# Altium footprint library Miscellaneous Connectors.PcbLib: 248 footprints (part 14 of 16)
Each footprint in its own frame and in the unit in brackets; x right, y up, seen from the top. Pads: shape width x height; smd on the part's side, far side on the other; paste and mask are expansions set on the pad; w line width, h text height; cw(c..) or ccw(c..) is an arc to the next point about the centre after c.
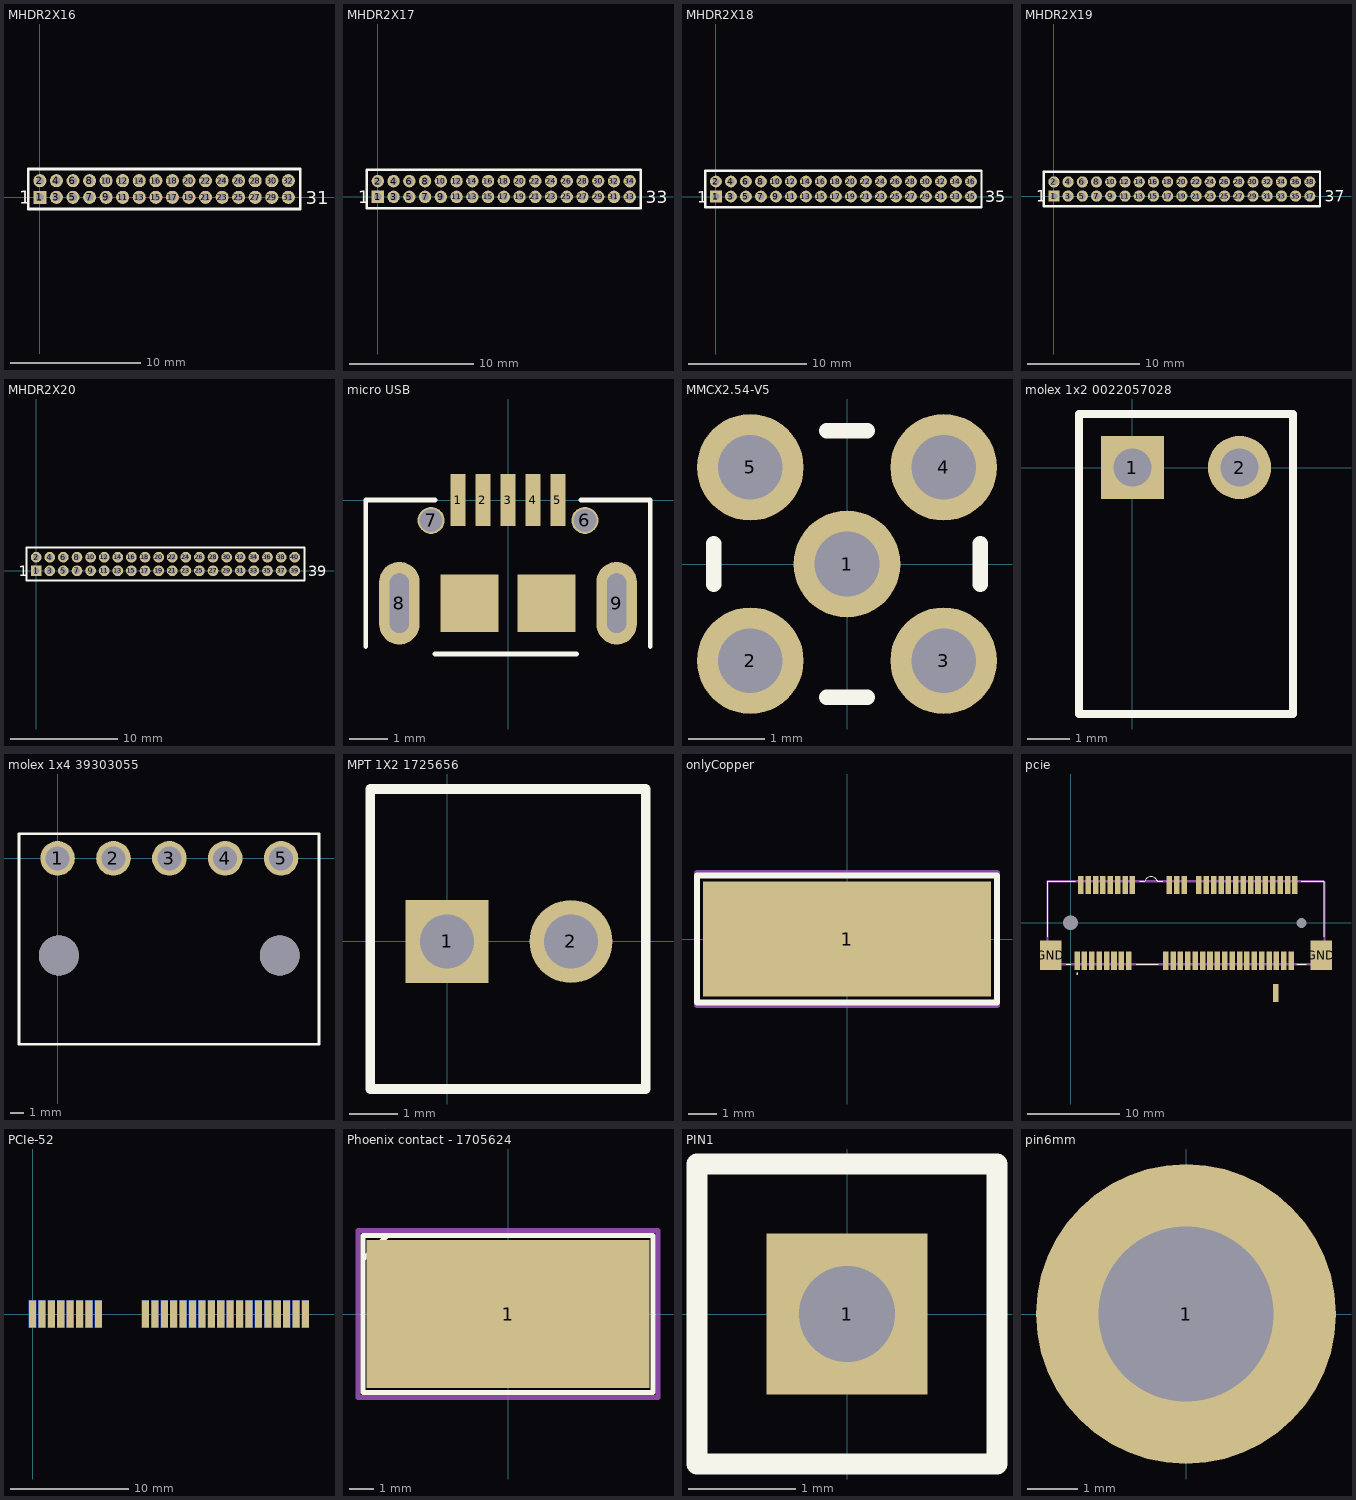
[diagram p13: the footprints below, top view; thin cyan lines are the x and y axes]

## MHDR2X16 [mm] "Connector; Header; 16x2 Position"
pads (32):
  rect 1x1 hole 0.6: 1(0,0)
  round 1 hole 0.6: 2(0,1.27) 3(1.27,0) 4(1.27,1.27) 5(2.54,0) 6(2.54,1.27) 7(3.81,0) 8(3.81,1.27) 9(5.08,0) 10(5.08,1.27) 11(6.35,0) 12(6.35,1.27) 13(7.62,0) 14(7.62,1.27) 15(8.89,0) 16(8.89,1.27) 17(10.16,0) 18(10.16,1.27) 19(11.43,0) 20(11.43,1.27) 21(12.7,0) 22(12.7,1.27) 23(13.97,0) 24(13.97,1.27) 25(15.24,0) 26(15.24,1.27) 27(16.51,0) 28(16.51,1.27) 29(17.78,0) 30(17.78,1.27) 31(19.05,0) 32(19.05,1.27)
Top Overlay:
  lines w0.2: -0.9,-0.9 -0.9,2.17 19.95,2.17 19.95,-0.9 -0.9,-0.9
  text "31" at 20.4,-0.522 h1
  text "1" at -1.6,-0.508 h1

## MHDR2X17 [mm] "Connector; Header; 17x2 Position"
pads (34):
  rect 1x1 hole 0.6: 1(0,0)
  round 1 hole 0.6: 2(0,1.27) 3(1.27,0) 4(1.27,1.27) 5(2.54,0) 6(2.54,1.27) 7(3.81,0) 8(3.81,1.27) 9(5.08,0) 10(5.08,1.27) 11(6.35,0) 12(6.35,1.27) 13(7.62,0) 14(7.62,1.27) 15(8.89,0) 16(8.89,1.27) 17(10.16,0) 18(10.16,1.27) 19(11.43,0) 20(11.43,1.27) 21(12.7,0) 22(12.7,1.27) 23(13.97,0) 24(13.97,1.27) 25(15.24,0) 26(15.24,1.27) 27(16.51,0) 28(16.51,1.27) 29(17.78,0) 30(17.78,1.27) 31(19.05,0) 32(19.05,1.27) 33(20.32,0) 34(20.32,1.27)
Top Overlay:
  lines w0.2: -0.9,-0.9 21.22,-0.9 21.22,2.17 -0.9,2.17 -0.9,-0.9
  text "1" at -1.6,-0.508 h1
  text "33" at 21.6,-0.508 h1

## MHDR2X18 [mm] "Connector; Header; 18x2 Position"
pads (36):
  rect 1x1 hole 0.6: 1(0,0)
  round 1 hole 0.6: 2(0,1.27) 3(1.27,0) 4(1.27,1.27) 5(2.54,0) 6(2.54,1.27) 7(3.81,0) 8(3.81,1.27) 9(5.08,0) 10(5.08,1.27) 11(6.35,0) 12(6.35,1.27) 13(7.62,0) 14(7.62,1.27) 15(8.89,0) 16(8.89,1.27) 17(10.16,0) 18(10.16,1.27) 19(11.43,0) 20(11.43,1.27) 21(12.7,0) 22(12.7,1.27) 23(13.97,0) 24(13.97,1.27) 25(15.24,0) 26(15.24,1.27) 27(16.51,0) 28(16.51,1.27) 29(17.78,0) 30(17.78,1.27) 31(19.05,0) 32(19.05,1.27) 33(20.32,0) 34(20.32,1.27) 35(21.59,0) 36(21.59,1.27)
Top Overlay:
  lines w0.2: -0.9,-0.9 -0.9,2.17 22.49,2.17 22.49,-0.9 -0.9,-0.9
  text "35" at 22.8,-0.501 h1
  text "1" at -1.6,-0.508 h1

## MHDR2X19 [mm] "Connector; Header; 19x2 Position"
pads (38):
  rect 1x1 hole 0.6: 1(0,0)
  round 1 hole 0.6: 2(0,1.27) 3(1.27,0) 4(1.27,1.27) 5(2.54,0) 6(2.54,1.27) 7(3.81,0) 8(3.81,1.27) 9(5.08,0) 10(5.08,1.27) 11(6.35,0) 12(6.35,1.27) 13(7.62,0) 14(7.62,1.27) 15(8.89,0) 16(8.89,1.27) 17(10.16,0) 18(10.16,1.27) 19(11.43,0) 20(11.43,1.27) 21(12.7,0) 22(12.7,1.27) 23(13.97,0) 24(13.97,1.27) 25(15.24,0) 26(15.24,1.27) 27(16.51,0) 28(16.51,1.27) 29(17.78,0) 30(17.78,1.27) 31(19.05,0) 32(19.05,1.27) 33(20.32,0) 34(20.32,1.27) 35(21.59,0) 36(21.59,1.27) 37(22.86,0) 38(22.86,1.27)
Top Overlay:
  lines w0.2: -0.9,-0.9 -0.9,2.17 23.76,2.17 23.76,-0.9 -0.9,-0.9
  text "37" at 24.2,-0.508 h1
  text "1" at -1.6,-0.508 h1

## MHDR2X20 [mm] "Connector; Header; 20x2 Position"
pads (40):
  rect 1x1 hole 0.6: 1(0,0)
  round 1 hole 0.6: 2(0,1.27) 3(1.27,0) 4(1.27,1.27) 5(2.54,0) 6(2.54,1.27) 7(3.81,0) 8(3.81,1.27) 9(5.08,0) 10(5.08,1.27) 11(6.35,0) 12(6.35,1.27) 13(7.62,0) 14(7.62,1.27) 15(8.89,0) 16(8.89,1.27) 17(10.16,0) 18(10.16,1.27) 19(11.43,0) 20(11.43,1.27) 21(12.7,0) 22(12.7,1.27) 23(13.97,0) 24(13.97,1.27) 25(15.24,0) 26(15.24,1.27) 27(16.51,0) 28(16.51,1.27) 29(17.78,0) 30(17.78,1.27) 31(19.05,0) 32(19.05,1.27) 33(20.32,0) 34(20.32,1.27) 35(21.59,0) 36(21.59,1.27) 37(22.86,0) 38(22.86,1.27) 39(24.13,0) 40(24.13,1.27)
Top Overlay:
  lines w0.2: -0.9,-0.9 -0.9,2.17 25.03,2.17 25.03,-0.9 -0.9,-0.9
  text "39" at 25.4,-0.508 h1
  text "1" at -1.6,-0.508 h1

## micro USB [mm] "USB3080-30-00-A"
pads (11):
  rect 0.4x1.35 smd: 1(-1.3,0) 2(-0.65,0) 3(0,0) 4(0.65,0) 5(1.3,0)
  round 0.7 hole 0.6 mask+0: 6(2,-0.53) 7(-2,-0.53)
  oval 1.05x2.15 hole 0.5 slot 1.55 at 90 deg: 8(-2.825,-2.68) 9(2.825,-2.68)
  rect 1.5x1.5 smd: ""(-1,-2.68) ""(1,-2.68)
Top Overlay:
  lines w0.127: -3.7,-3.81 -3.7,0 -1.9,0 ; -1.905,-4 1.778,-4 ; 1.9,0 3.7,0 3.7,-3.81

## MMCX2.54-V5 [mm] "Connector; RF Coaxial, MMCX, Thru-Hole; 5 Position; Vertical"
height 4.45
pads (5):
  round 1.4 hole 0.85: 1(0,0) 2(-1.27,-1.27) 3(1.27,-1.27) 4(1.27,1.27) 5(-1.27,1.27)
Top Overlay:
  lines w0.2: -1.75,-0.27 -1.75,0.27 ; -0.27,-1.75 0.27,-1.75 ; -0.27,1.75 0.27,1.75 ; 1.75,-0.27 1.75,0.27

## molex 1x2 0022057028 [mm] "conector molex 1x2"
pads (2):
  rect 1.5x1.5 hole 0.9: 1(0,0)
  round 1.5 hole 0.9: 2(2.54,0)
Top Overlay:
  lines w0.2: -1.27,-5.85 -1.27,1.27 3.81,1.27 3.81,-5.85 -1.27,-5.85
3D body "conector molex - 022057028.stp": height 6.12, standoff -3.52, extent -1.265,-14.438 3.815,0.3

## molex 1x4 39303055 [mm] "conector molex 1x4 hembra"
pads (7):
  round 2.6 hole 1.8: 1(0,0) 2(4.2,0) 3(8.4,0) 4(12.6,0) 5(16.8,0)
  round 3 hole 3 mask+0.102: ""(0.098,-7.3) ""(16.702,-7.3)
Top Overlay:
  lines w0.2: 19.625,1.85 -2.9,1.85 -2.9,-13.975 19.65,-13.975 19.65,1.85
3D body "conector molex - 039303055.stp": height 7.2, standoff -3.5, extent -2.7,-13.81 19.5,0.625

## MPT 1X2 1725656 [mm] "PHOENIX CONTACT; pitch 2.54"
pads (2):
  rect 1.7x1.7 hole 1.1: 1(0,0)
  round 1.7 hole 1.1: 2(2.54,0)
Top Overlay:
  lines w0.2: -1.575,-3.025 4.075,-3.025 4.075,3.125 -1.575,3.125 -1.575,-3.025
3D body "conector MPT-0-5-2-2-54 1725656.stp": height 8.5, standoff -3.5, extent -1.6,-3 4,3.2

## onlyCopper [mm] "pad"
pads (1):
  rect 10x4 smd: 1(0,0)
Top Overlay:
  lines w0.2: -5.2,-2.2 -5.2,2.2 5.2,2.2 5.2,-2.2 -5.2,-2.2
Mechanical 15:
  lines w0.2: -5.2,-2.3 5.2,-2.3 5.2,2.3 -5.2,2.3 -5.2,-2.3

## pcie [mm]
height 12.65
pads (56):
  rect 0.6x2 smd paste-2: 1(0.7,-4.1) 2(1.1,4.1) 3(1.5,-4.1) 4(1.9,4.1) 5(2.3,-4.1) 6(2.7,4.1) 7(3.1,-4.1) 8(3.5,4.1) 9(3.9,-4.1) 10(4.3,4.1) 11(4.7,-4.1) 12(5.1,4.1) 13(5.5,-4.1) 14(5.9,4.1) 15(6.3,-4.1) 16(6.7,4.1) 17(10.3,-4.1) 18(10.7,4.1) 19(11.1,-4.1) 20(11.5,4.1) 21(11.9,-4.1) 22(12.3,4.1) 23(12.7,-4.1) 24(22.2,-7.6) 25(13.5,-4.1) 26(13.9,4.1) 27(14.3,-4.1) 28(14.7,4.1) 29(15.1,-4.1) 30(15.5,4.1) 31(15.9,-4.1) 32(16.3,4.1) 33(16.7,-4.1) 34(17.1,4.1) 35(17.5,-4.1) 36(17.9,4.1) 37(18.3,-4.1) 38(18.7,4.1) 39(19.1,-4.1) 40(19.5,4.1) 41(19.9,-4.1) 42(20.3,4.1) 43(20.7,-4.1) 44(21.1,4.1) 45(21.5,-4.1) 46(21.9,4.1) 47(22.3,-4.1) 48(22.7,4.1) 49(23.1,-4.1) 50(23.5,4.1) 51(23.9,-4.1) 52(24.3,4.1)
  rect 2.3x3.2 smd paste-2: GND(-2.15,-3.5) GND(27.15,-3.5)
  round 1.4 hole 1.6 unplated: MH1(0,0)
  round 0.9 hole 1.1 unplated: MH2(25,0)
Top Overlay:
  circle w0.1: c0.7,-5.5 r0.05
  lines w0.1: -2.5,-1.5 -2.5,4.5 0.5,4.5 ; -0.5,-4.5 0,-4.5 ; 7.1,-4.5 9.5,-4.5 ; 7.5,4.5 8,4.5 ; 8.006,4.498 cw(c8.709,4.236) 9.413,4.497 ; 9.421,4.5 10,4.5 ; 24.5,-4.5 25.5,-4.5 ; 25,4.5 27.5,4.5 27.5,-1.5
Mechanical 1:
  lines w0.254: -2.5,-4.5 27.5,-4.5 27.5,4.4 27.4,4.5 -2.5,4.5 -2.5,-4.5
3D body "socket_PCIe.STEP": height 4.1, standoff -0.55, extent -2.9,-4.377 27.774,4.577

## PCIe-52 [mm] "edge pads PCI express 52 pins"
pads (52):
  rect 0.6x2.3 smd: 1(0,0) 3(0.8,0) 5(1.6,0) 7(2.4,0) 9(3.2,0) 11(4,0) 13(4.8,0) 15(5.6,0) 17(9.6,0) 19(10.4,0) 21(11.2,0) 23(12,0) 25(12.8,0) 27(13.6,0) 29(14.4,0) 31(15.2,0) 33(16,0) 35(16.8,0) 37(17.6,0) 39(18.4,0) 41(19.2,0) 43(20,0) 45(20.8,0) 47(21.6,0) 49(22.4,0) 51(23.2,0)
  rect 0.6x2.3 smd far side: 2(0,0) 4(0.8,0) 6(1.6,0) 8(2.4,0) 10(3.2,0) 12(4,0) 14(4.8,0) 16(5.6,0) 18(9.6,0) 20(10.4,0) 22(11.2,0) 24(12,0) 26(12.8,0) 28(13.6,0) 30(14.4,0) 32(15.2,0) 34(16,0) 36(16.8,0) 38(17.6,0) 40(18.4,0) 42(19.2,0) 44(20,0) 46(20.8,0) 48(21.6,0) 50(22.4,0) 52(23.2,0)

## Phoenix contact - 1705624 [mm] "fabricante Phoenix contact"
pads (1):
  rect 11.5x6 smd: 1(0,0)
Top Overlay:
  lines w0.2: -5.9,2.2 -4.963,3.137 ; -5.9,-3.2 -5.9,3.2 5.9,3.2 5.9,-3.2 -5.9,-3.2
Mechanical 15:
  lines w0.2: -6.1,-3.4 6.1,-3.4 6.1,3.4 -6.1,3.4 -6.1,-3.4
3D body "conector Phoenix contact - 1705624.stp": height 9.8, standoff 0, extent -5.7,-4.325 9.8,8.325

## PIN1 [mm] "Connector; Plug"
pads (1):
  rect 1.5x1.5 hole 0.9: 1(0,0)
Top Overlay:
  lines w0.2: -1.4,-1.4 -1.4,1.4 1.4,1.4 1.4,-1.4 -1.4,-1.4
3D body "pin1x1.step": height 8.38, standoff -2.92, extent -1.27,-1.27 1.27,1.27

## pin6mm [mm]
pads (1):
  round 6 hole 3.5: 1(0,0)